# Altium integrated library ALTIUM-PHD_2_54_DUAL_SOCKET_HEADER_6130XX21821.IntLib: 198 symbols (part 1 of 2)
Pins are listed as number, name and electrical type; pins without a type are passive.

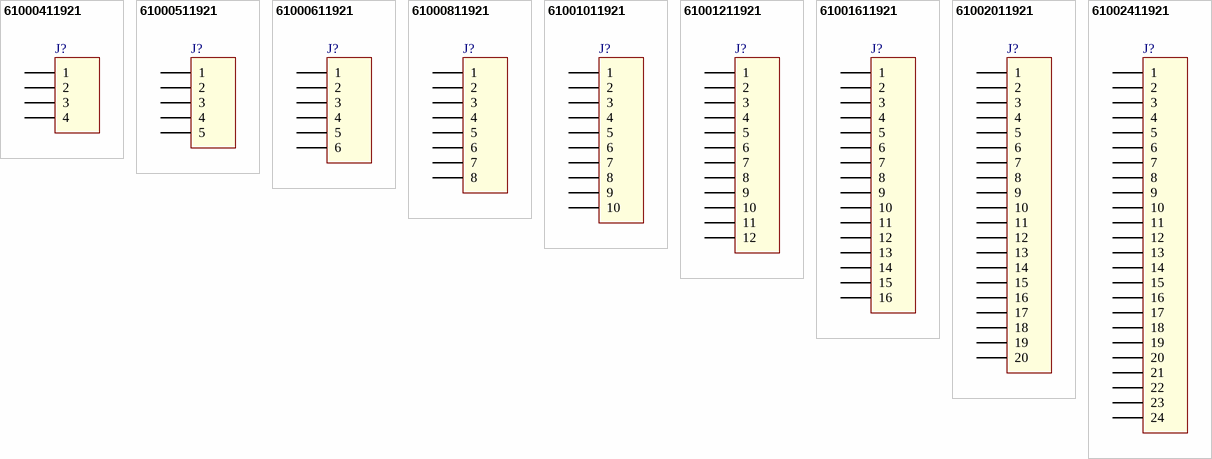
[diagram p0: symbols 61000411921 to 61002411921]

## 61000411921
designator J?
WR-PHD 2.54 mm SMT Socket Header, 4p; Part Number: 61000411921; Pin Number: 4; Rated Current: 3A; Working Voltage: 250V AC; Withstanding Voltage: 500V AC; Pitch: 2.54mm; ComponentLink1Description: Manufacturer; ComponentLink1URL: http://www.we-online.de; ComponentLink2Description: Datasheet; ComponentLink2URL: http://katalog.we-online.de/em/datasheet/6100xx11921.pdf; Published Date: August 2017; Publisher: Wurth Elektronik
footprint 61000411921
pins: 1, 2, 3, 4

## 61000511921
designator J?
WR-PHD 2.54 mm SMT Socket Header, 5p; Part Number: 61000511921; Pin Number: 5; Rated Current: 3A; Working Voltage: 250V AC; Withstanding Voltage: 500V AC; Pitch: 2.54mm; ComponentLink1Description: Manufacturer; ComponentLink1URL: http://www.we-online.de; ComponentLink2Description: Datasheet; ComponentLink2URL: http://katalog.we-online.de/em/datasheet/6100xx11921.pdf; Published Date: August 2017; Publisher: Wurth Elektronik
footprint 61000511921
pins: 1, 2, 3, 4, 5

## 61000611921
designator J?
WR-PHD 2.54 mm SMT Socket Header, 6p; Part Number: 61000611921; Pin Number: 6; Rated Current: 3A; Working Voltage: 250V AC; Withstanding Voltage: 500V AC; Pitch: 2.54mm; ComponentLink1Description: Manufacturer; ComponentLink1URL: http://www.we-online.de; ComponentLink2Description: Datasheet; ComponentLink2URL: http://katalog.we-online.de/em/datasheet/6100xx11921.pdf; Published Date: August 2017; Publisher: Wurth Elektronik
footprint 61000611921
pins: 1, 2, 3, 4, 5, 6

## 61000811921
designator J?
WR-PHD 2.54 mm SMT Socket Header, 8p; Part Number: 61000811921; Pin Number: 8; Rated Current: 3A; Working Voltage: 250V AC; Withstanding Voltage: 500V AC; Pitch: 2.54mm; ComponentLink1Description: Manufacturer; ComponentLink1URL: http://www.we-online.de; ComponentLink2Description: Datasheet; ComponentLink2URL: http://katalog.we-online.de/em/datasheet/6100xx11921.pdf; Published Date: August 2017; Publisher: Wurth Elektronik
footprint 61000811921
pins: 1, 2, 3, 4, 5, 6, 7, 8

## 61001011921
designator J?
WR-PHD 2.54 mm SMT Socket Header, 10p; Part Number: 61001011921; Pin Number: 10; Rated Current: 3A; Working Voltage: 250V AC; Withstanding Voltage: 500V AC; Pitch: 2.54mm; ComponentLink1Description: Manufacturer; ComponentLink1URL: http://www.we-online.de; ComponentLink2Description: Datasheet; ComponentLink2URL: http://katalog.we-online.de/em/datasheet/6100xx11921.pdf; Published Date: August 2017; Publisher: Wurth Elektronik
footprint 61001011921
pins: 1, 2, 3, 4, 5, 6, 7, 8, 9, 10

## 61001211921
designator J?
WR-PHD 2.54 mm SMT Socket Header, 12p; Part Number: 61001211921; Pin Number: 12; Rated Current: 3A; Working Voltage: 250V AC; Withstanding Voltage: 500V AC; Pitch: 2.54mm; ComponentLink1Description: Manufacturer; ComponentLink1URL: http://www.we-online.de; ComponentLink2Description: Datasheet; ComponentLink2URL: http://katalog.we-online.de/em/datasheet/6100xx11921.pdf; Published Date: August 2017; Publisher: Wurth Elektronik
footprint 61001211921
pins: 1, 2, 3, 4, 5, 6, 7, 8, 9, 10, 11, 12

## 61001611921
designator J?
WR-PHD 2.54 mm SMT Socket Header, 16p; Part Number: 61001611921; Pin Number: 16; Rated Current: 3A; Working Voltage: 250V AC; Withstanding Voltage: 500V AC; Pitch: 2.54mm; ComponentLink1Description: Manufacturer; ComponentLink1URL: http://www.we-online.de; ComponentLink2Description: Datasheet; ComponentLink2URL: http://katalog.we-online.de/em/datasheet/6100xx11921.pdf; Published Date: August 2017; Publisher: Wurth Elektronik
footprint 61001611921
pins: 1, 2, 3, 4, 5, 6, 7, 8, 9, 10, 11, 12, 13, 14, 15, 16

## 61002011921
designator J?
WR-PHD 2.54 mm SMT Socket Header, 20p; Part Number: 61002011921; Pin Number: 20; Rated Current: 3A; Working Voltage: 250V AC; Withstanding Voltage: 500V AC; Pitch: 2.54mm; ComponentLink1Description: Manufacturer; ComponentLink1URL: http://www.we-online.de; ComponentLink2Description: Datasheet; ComponentLink2URL: http://katalog.we-online.de/em/datasheet/6100xx11921.pdf; Published Date: August 2017; Publisher: Wurth Elektronik
footprint 61002011921
pins: 1, 2, 3, 4, 5, 6, 7, 8, 9, 10, 11, 12, 13, 14, 15, 16, 17, 18, 19, 20

## 61002411921
designator J?
WR-PHD 2.54 mm SMT Socket Header, 24p; Part Number: 61002411921; Pin Number: 24; Rated Current: 3A; Working Voltage: 250V AC; Withstanding Voltage: 500V AC; Pitch: 2.54mm; ComponentLink1Description: Manufacturer; ComponentLink1URL: http://www.we-online.de; ComponentLink2Description: Datasheet; ComponentLink2URL: http://katalog.we-online.de/em/datasheet/6100xx11921.pdf; Published Date: August 2017; Publisher: Wurth Elektronik
footprint 61002411921
pins: 1, 2, 3, 4, 5, 6, 7, 8, 9, 10, 11, 12, 13, 14, 15, 16, 17, 18, 19, 20, 21, 22, 23, 24


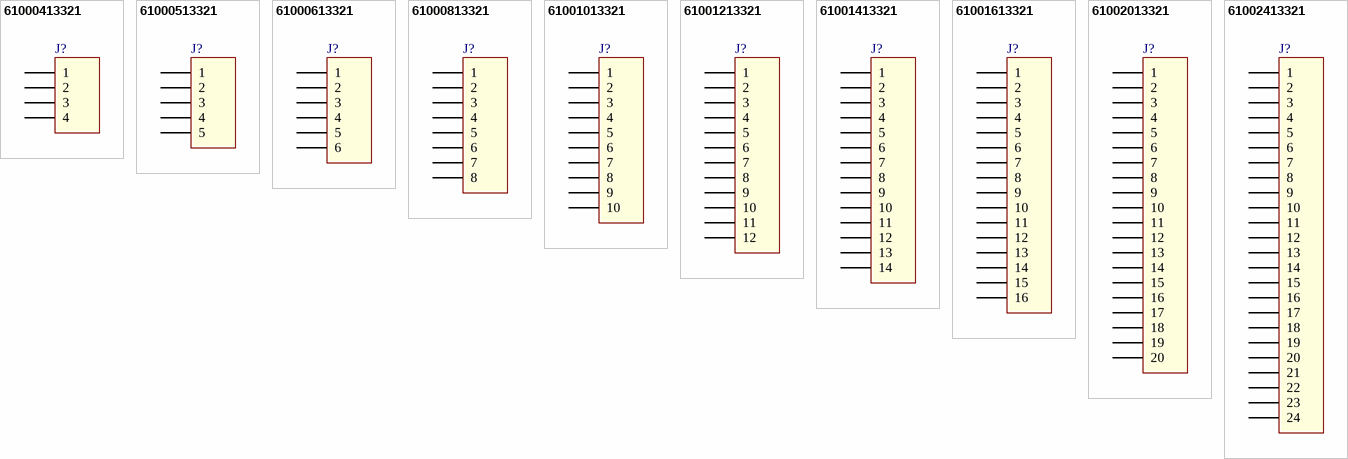
[diagram p1: symbols 61000413321 to 61002413321]

## 61000413321
designator J?
WR-PHD 2.54 mm SMT Socket Header, 4p; Part Number: 61000413321; Pin Number: 4; Rated Current: 3A; Working Voltage: 250V AC; Withstanding Voltage: 500V AC; Pitch: 2.54mm; ComponentLink1Description: Manufacturer; ComponentLink1URL: http://www.we-online.de; ComponentLink2Description: Datasheet; ComponentLink2URL: http://katalog.we-online.de/em/datasheet/6100xx13321.pdf; Published Date: August 2017; Publisher: Wurth Elektronik
footprint 61000413321
pins: 1, 2, 3, 4

## 61000513321
designator J?
WR-PHD 2.54 mm SMT Socket Header, 5p; Part Number: 61000513321; Pin Number: 5; Rated Current: 3A; Working Voltage: 250V AC; Withstanding Voltage: 500V AC; Pitch: 2.54mm; ComponentLink1Description: Manufacturer; ComponentLink1URL: http://www.we-online.de; ComponentLink2Description: Datasheet; ComponentLink2URL: http://katalog.we-online.de/em/datasheet/6100xx13321.pdf; Published Date: August 2017; Publisher: Wurth Elektronik
footprint 61000513321
pins: 1, 2, 3, 4, 5

## 61000613321
designator J?
WR-PHD 2.54 mm SMT Socket Header, 6p; Part Number: 61000613321; Pin Number: 6; Rated Current: 3A; Working Voltage: 250V AC; Withstanding Voltage: 500V AC; Pitch: 2.54mm; ComponentLink1Description: Manufacturer; ComponentLink1URL: http://www.we-online.de; ComponentLink2Description: Datasheet; ComponentLink2URL: http://katalog.we-online.de/em/datasheet/6100xx13321.pdf; Published Date: August 2017; Publisher: Wurth Elektronik
footprint 61000613321
pins: 1, 2, 3, 4, 5, 6

## 61000813321
designator J?
WR-PHD 2.54 mm SMT Socket Header, 8p; Part Number: 61000813321; Pin Number: 8; Rated Current: 3A; Working Voltage: 250V AC; Withstanding Voltage: 500V AC; Pitch: 2.54mm; ComponentLink1Description: Manufacturer; ComponentLink1URL: http://www.we-online.de; ComponentLink2Description: Datasheet; ComponentLink2URL: http://katalog.we-online.de/em/datasheet/6100xx13321.pdf; Published Date: August 2017; Publisher: Wurth Elektronik
footprint 61000813321
pins: 1, 2, 3, 4, 5, 6, 7, 8

## 61001013321
designator J?
WR-PHD 2.54 mm SMT Socket Header, 10p; Part Number: 61001013321; Pin Number: 10; Rated Current: 3A; Working Voltage: 250V AC; Withstanding Voltage: 500V AC; Pitch: 2.54mm; ComponentLink1Description: Manufacturer; ComponentLink1URL: http://www.we-online.de; ComponentLink2Description: Datasheet; ComponentLink2URL: http://katalog.we-online.de/em/datasheet/6100xx13321.pdf; Published Date: August 2017; Publisher: Wurth Elektronik
footprint 61001013321
pins: 1, 2, 3, 4, 5, 6, 7, 8, 9, 10

## 61001213321
designator J?
WR-PHD 2.54 mm SMT Socket Header, 12p; Part Number: 61001213321; Pin Number: 12; Rated Current: 3A; Working Voltage: 250V AC; Withstanding Voltage: 500V AC; Pitch: 2.54mm; ComponentLink1Description: Manufacturer; ComponentLink1URL: http://www.we-online.de; ComponentLink2Description: Datasheet; ComponentLink2URL: http://katalog.we-online.de/em/datasheet/6100xx13321.pdf; Published Date: August 2017; Publisher: Wurth Elektronik
footprint 61001213321
pins: 1, 2, 3, 4, 5, 6, 7, 8, 9, 10, 11, 12

## 61001413321
designator J?
WR-PHD 2.54 mm SMT Socket Header, 14p; Part Number: 61001413321; Pin Number: 14; Rated Current: 3A; Working Voltage: 250V AC; Withstanding Voltage: 500V AC; Pitch: 2.54mm; ComponentLink1Description: Manufacturer; ComponentLink1URL: http://www.we-online.de; ComponentLink2Description: Datasheet; ComponentLink2URL: http://katalog.we-online.de/em/datasheet/6100xx13321.pdf; Published Date: August 2017; Publisher: Wurth Elektronik
footprint 61001413321
pins: 1, 2, 3, 4, 5, 6, 7, 8, 9, 10, 11, 12, 13, 14

## 61001613321
designator J?
WR-PHD 2.54 mm SMT Socket Header, 16p; Part Number: 61001613321; Pin Number: 16; Rated Current: 3A; Working Voltage: 250V AC; Withstanding Voltage: 500V AC; Pitch: 2.54mm; ComponentLink1Description: Manufacturer; ComponentLink1URL: http://www.we-online.de; ComponentLink2Description: Datasheet; ComponentLink2URL: http://katalog.we-online.de/em/datasheet/6100xx13321.pdf; Published Date: August 2017; Publisher: Wurth Elektronik
footprint 61001613321
pins: 1, 2, 3, 4, 5, 6, 7, 8, 9, 10, 11, 12, 13, 14, 15, 16

## 61002013321
designator J?
WR-PHD 2.54 mm SMT Socket Header, 20p; Part Number: 61002013321; Pin Number: 20; Rated Current: 3A; Working Voltage: 250V AC; Withstanding Voltage: 500V AC; Pitch: 2.54mm; ComponentLink1Description: Manufacturer; ComponentLink1URL: http://www.we-online.de; ComponentLink2Description: Datasheet; ComponentLink2URL: http://katalog.we-online.de/em/datasheet/6100xx13321.pdf; Published Date: August 2017; Publisher: Wurth Elektronik
footprint 61002013321
pins: 1, 2, 3, 4, 5, 6, 7, 8, 9, 10, 11, 12, 13, 14, 15, 16, 17, 18, 19, 20

## 61002413321
designator J?
WR-PHD 2.54 mm SMT Socket Header, 24p; Part Number: 61002413321; Pin Number: 24; Rated Current: 3A; Working Voltage: 250V AC; Withstanding Voltage: 500V AC; Pitch: 2.54mm; ComponentLink1Description: Manufacturer; ComponentLink1URL: http://www.we-online.de; ComponentLink2Description: Datasheet; ComponentLink2URL: http://katalog.we-online.de/em/datasheet/6100xx13321.pdf; Published Date: August 2017; Publisher: Wurth Elektronik
footprint 61002413321
pins: 1, 2, 3, 4, 5, 6, 7, 8, 9, 10, 11, 12, 13, 14, 15, 16, 17, 18, 19, 20, 21, 22, 23, 24


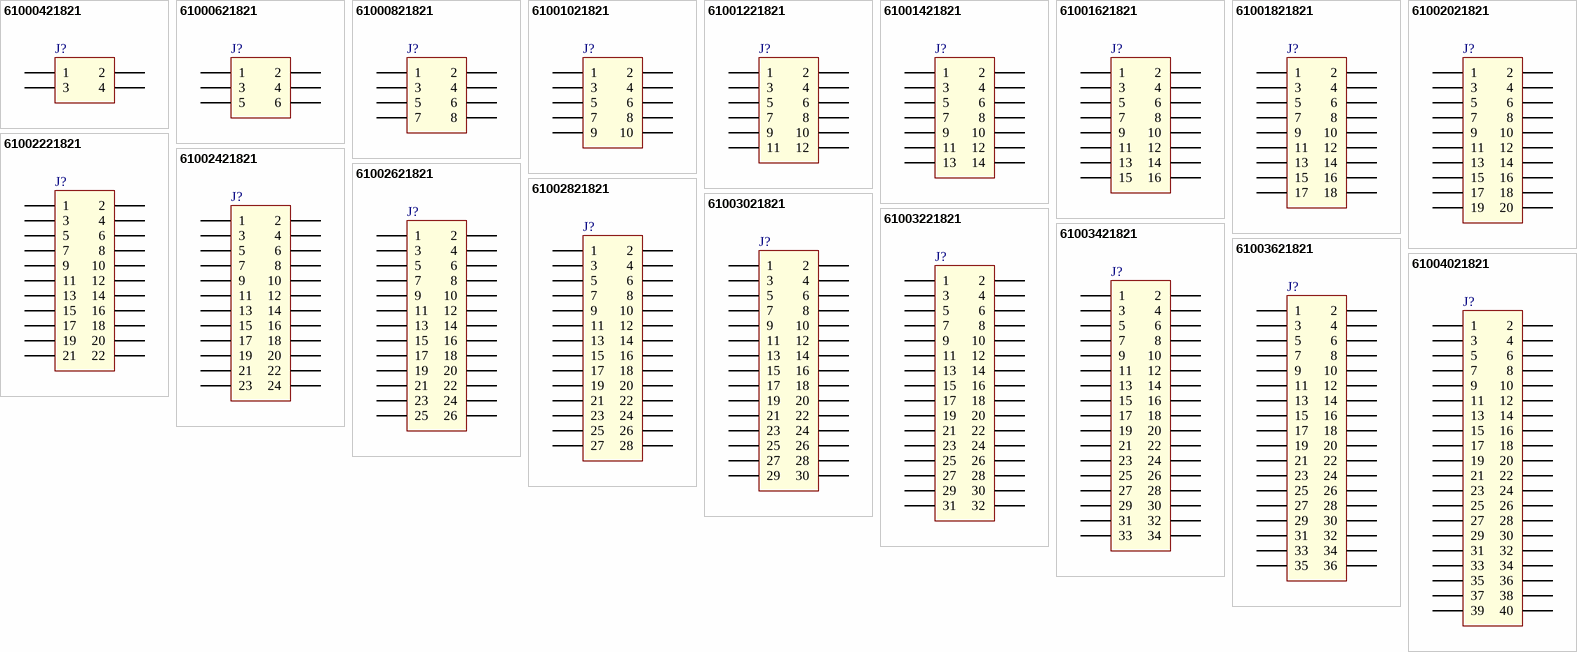
[diagram p2: symbols 61000421821 to 61004021821]

## 61000421821
designator J?
WR-PHD 2.54 mm Dual SMT Socket Header, 4p; Part Number: 61000421821; Pin Number: 4; Rated Current: 3A; Working Voltage: 250V AC; Withstanding Voltage: 600V AC; Pitch: 2.54mm; ComponentLink1Description: Manufacturer; ComponentLink1URL: http://www.we-online.de; ComponentLink2Description: Datasheet; ComponentLink2URL: http://katalog.we-online.de/em/datasheet/6100xx21821.pdf; Published Date: August 2017; Publisher: Wurth Elektronik
footprint 61000421821
pins: 1, 2, 3, 4

## 61000621821
designator J?
WR-PHD 2.54 mm Dual SMT Socket Header, 6p; Part Number: 61000621821; Pin Number: 6; Rated Current: 3A; Working Voltage: 250V AC; Withstanding Voltage: 600V AC; Pitch: 2.54mm; ComponentLink1Description: Manufacturer; ComponentLink1URL: http://www.we-online.de; ComponentLink2Description: Datasheet; ComponentLink2URL: http://katalog.we-online.de/em/datasheet/6100xx21821.pdf; Published Date: August 2017; Publisher: Wurth Elektronik
footprint 61000621821
pins: 1, 2, 3, 4, 5, 6

## 61000821821
designator J?
WR-PHD 2.54 mm Dual SMT Socket Header, 8p; Part Number: 61000821821; Pin Number: 8; Rated Current: 3A; Working Voltage: 250V AC; Withstanding Voltage: 600V AC; Pitch: 2.54mm; ComponentLink1Description: Manufacturer; ComponentLink1URL: http://www.we-online.de; ComponentLink2Description: Datasheet; ComponentLink2URL: http://katalog.we-online.de/em/datasheet/6100xx21821.pdf; Published Date: August 2017; Publisher: Wurth Elektronik
footprint 61000821821
pins: 1, 2, 3, 4, 5, 6, 7, 8

## 61001021821
designator J?
WR-PHD 2.54 mm Dual SMT Socket Header, 10p; Part Number: 61001021821; Pin Number: 10; Rated Current: 3A; Working Voltage: 250V AC; Withstanding Voltage: 600V AC; Pitch: 2.54mm; ComponentLink1Description: Manufacturer; ComponentLink1URL: http://www.we-online.de; ComponentLink2Description: Datasheet; ComponentLink2URL: http://katalog.we-online.de/em/datasheet/6100xx21821.pdf; Published Date: August 2017; Publisher: Wurth Elektronik
footprint 61001021821
pins: 1, 2, 3, 4, 5, 6, 7, 8, 9, 10

## 61001221821
designator J?
WR-PHD 2.54 mm Dual SMT Socket Header, 12p; Part Number: 61001221821; Pin Number: 12; Rated Current: 3A; Working Voltage: 250V AC; Withstanding Voltage: 600V AC; Pitch: 2.54mm; ComponentLink1Description: Manufacturer; ComponentLink1URL: http://www.we-online.de; ComponentLink2Description: Datasheet; ComponentLink2URL: http://katalog.we-online.de/em/datasheet/6100xx21821.pdf; Published Date: August 2017; Publisher: Wurth Elektronik
footprint 61001221821
pins: 1, 2, 3, 4, 5, 6, 7, 8, 9, 10, 11, 12

## 61001421821
designator J?
WR-PHD 2.54 mm Dual SMT Socket Header, 14p; Part Number: 61001421821; Pin Number: 14; Rated Current: 3A; Working Voltage: 250V AC; Withstanding Voltage: 600V AC; Pitch: 2.54mm; ComponentLink1Description: Manufacturer; ComponentLink1URL: http://www.we-online.de; ComponentLink2Description: Datasheet; ComponentLink2URL: http://katalog.we-online.de/em/datasheet/6100xx21821.pdf; Published Date: August 2017; Publisher: Wurth Elektronik
footprint 61001421821
pins: 1, 2, 3, 4, 5, 6, 7, 8, 9, 10, 11, 12, 13, 14

## 61001621821
designator J?
WR-PHD 2.54 mm Dual SMT Socket Header, 16p; Part Number: 61001621821; Pin Number: 16; Rated Current: 3A; Working Voltage: 250V AC; Withstanding Voltage: 600V AC; Pitch: 2.54mm; ComponentLink1Description: Manufacturer; ComponentLink1URL: http://www.we-online.de; ComponentLink2Description: Datasheet; ComponentLink2URL: http://katalog.we-online.de/em/datasheet/6100xx21821.pdf; Published Date: August 2017; Publisher: Wurth Elektronik
footprint 61001621821
pins: 1, 2, 3, 4, 5, 6, 7, 8, 9, 10, 11, 12, 13, 14, 15, 16

## 61001821821
designator J?
WR-PHD 2.54 mm Dual SMT Socket Header, 18p; Part Number: 61001821821; Pin Number: 18; Rated Current: 3A; Working Voltage: 250V AC; Withstanding Voltage: 600V AC; Pitch: 2.54mm; ComponentLink1Description: Manufacturer; ComponentLink1URL: http://www.we-online.de; ComponentLink2Description: Datasheet; ComponentLink2URL: http://katalog.we-online.de/em/datasheet/6100xx21821.pdf; Published Date: August 2017; Publisher: Wurth Elektronik
footprint 61001821821
pins: 1, 2, 3, 4, 5, 6, 7, 8, 9, 10, 11, 12, 13, 14, 15, 16, 17, 18

## 61002021821
designator J?
WR-PHD 2.54 mm Dual SMT Socket Header, 20p; Part Number: 61002021821; Pin Number: 20; Rated Current: 3A; Working Voltage: 250V AC; Withstanding Voltage: 600V AC; Pitch: 2.54mm; ComponentLink1Description: Manufacturer; ComponentLink1URL: http://www.we-online.de; ComponentLink2Description: Datasheet; ComponentLink2URL: http://katalog.we-online.de/em/datasheet/6100xx21821.pdf; Published Date: August 2017; Publisher: Wurth Elektronik
footprint 61002021821
pins: 1, 2, 3, 4, 5, 6, 7, 8, 9, 10, 11, 12, 13, 14, 15, 16, 17, 18, 19, 20

## 61002221821
designator J?
WR-PHD 2.54 mm Dual SMT Socket Header, 22p; Part Number: 61002221821; Pin Number: 22; Rated Current: 3A; Working Voltage: 250V AC; Withstanding Voltage: 600V AC; Pitch: 2.54mm; ComponentLink1Description: Manufacturer; ComponentLink1URL: http://www.we-online.de; ComponentLink2Description: Datasheet; ComponentLink2URL: http://katalog.we-online.de/em/datasheet/6100xx21821.pdf; Published Date: August 2017; Publisher: Wurth Elektronik
footprint 61002221821
pins: 1, 2, 3, 4, 5, 6, 7, 8, 9, 10, 11, 12, 13, 14, 15, 16, 17, 18, 19, 20, 21, 22

## 61002421821
designator J?
WR-PHD 2.54 mm Dual SMT Socket Header, 24p; Part Number: 61002421821; Pin Number: 24; Rated Current: 3A; Working Voltage: 250V AC; Withstanding Voltage: 600V AC; Pitch: 2.54mm; ComponentLink1Description: Manufacturer; ComponentLink1URL: http://www.we-online.de; ComponentLink2Description: Datasheet; ComponentLink2URL: http://katalog.we-online.de/em/datasheet/6100xx21821.pdf; Published Date: August 2017; Publisher: Wurth Elektronik
footprint 61002421821
pins: 1, 2, 3, 4, 5, 6, 7, 8, 9, 10, 11, 12, 13, 14, 15, 16, 17, 18, 19, 20, 21, 22, 23, 24

## 61002621821
designator J?
WR-PHD 2.54 mm Dual SMT Socket Header, 26p; Part Number: 61002621821; Pin Number: 26; Rated Current: 3A; Working Voltage: 250V AC; Withstanding Voltage: 600V AC; Pitch: 2.54mm; ComponentLink1Description: Manufacturer; ComponentLink1URL: http://www.we-online.de; ComponentLink2Description: Datasheet; ComponentLink2URL: http://katalog.we-online.de/em/datasheet/6100xx21821.pdf; Published Date: August 2017; Publisher: Wurth Elektronik
footprint 61002621821
pins: 1, 2, 3, 4, 5, 6, 7, 8, 9, 10, 11, 12, 13, 14, 15, 16, 17, 18, 19, 20, 21, 22, 23, 24, 25, 26

## 61002821821
designator J?
WR-PHD 2.54 mm Dual SMT Socket Header, 28p; Part Number: 61002821821; Pin Number: 28; Rated Current: 3A; Working Voltage: 250V AC; Withstanding Voltage: 600V AC; Pitch: 2.54mm; ComponentLink1Description: Manufacturer; ComponentLink1URL: http://www.we-online.de; ComponentLink2Description: Datasheet; ComponentLink2URL: http://katalog.we-online.de/em/datasheet/6100xx21821.pdf; Published Date: August 2017; Publisher: Wurth Elektronik
footprint 61002821821
pins: 1, 2, 3, 4, 5, 6, 7, 8, 9, 10, 11, 12, 13, 14, 15, 16, 17, 18, 19, 20, 21, 22, 23, 24, 25, 26, 27, 28

## 61003021821
designator J?
WR-PHD 2.54 mm Dual SMT Socket Header, 30p; Part Number: 61003021821; Pin Number: 30; Rated Current: 3A; Working Voltage: 250V AC; Withstanding Voltage: 600V AC; Pitch: 2.54mm; ComponentLink1Description: Manufacturer; ComponentLink1URL: http://www.we-online.de; ComponentLink2Description: Datasheet; ComponentLink2URL: http://katalog.we-online.de/em/datasheet/6100xx21821.pdf; Published Date: August 2017; Publisher: Wurth Elektronik
footprint 61003021821
pins: 1, 2, 3, 4, 5, 6, 7, 8, 9, 10, 11, 12, 13, 14, 15, 16, 17, 18, 19, 20, 21, 22, 23, 24, 25, 26, 27, 28, 29, 30

## 61003221821
designator J?
WR-PHD 2.54 mm Dual SMT Socket Header, 32p; Part Number: 61003221821; Pin Number: 32; Rated Current: 3A; Working Voltage: 250V AC; Withstanding Voltage: 600V AC; Pitch: 2.54mm; ComponentLink1Description: Manufacturer; ComponentLink1URL: http://www.we-online.de; ComponentLink2Description: Datasheet; ComponentLink2URL: http://katalog.we-online.de/em/datasheet/6100xx21821.pdf; Published Date: August 2017; Publisher: Wurth Elektronik
footprint 61003221821
pins: 1, 2, 3, 4, 5, 6, 7, 8, 9, 10, 11, 12, 13, 14, 15, 16, 17, 18, 19, 20, 21, 22, 23, 24, 25, 26, 27, 28, 29, 30, 31, 32

## 61003421821
designator J?
WR-PHD 2.54 mm Dual SMT Socket Header, 34p; Part Number: 61003421821; Pin Number: 34; Rated Current: 3A; Working Voltage: 250V AC; Withstanding Voltage: 600V AC; Pitch: 2.54mm; ComponentLink1Description: Manufacturer; ComponentLink1URL: http://www.we-online.de; ComponentLink2Description: Datasheet; ComponentLink2URL: http://katalog.we-online.de/em/datasheet/6100xx21821.pdf; Published Date: August 2017; Publisher: Wurth Elektronik
footprint 61003421821
pins: 1, 2, 3, 4, 5, 6, 7, 8, 9, 10, 11, 12, 13, 14, 15, 16, 17, 18, 19, 20, 21, 22, 23, 24, 25, 26, 27, 28, 29, 30, 31, 32, 33, 34

## 61003621821
designator J?
WR-PHD 2.54 mm Dual SMT Socket Header, 36p; Part Number: 61003621821; Pin Number: 36; Rated Current: 3A; Working Voltage: 250V AC; Withstanding Voltage: 600V AC; Pitch: 2.54mm; ComponentLink1Description: Manufacturer; ComponentLink1URL: http://www.we-online.de; ComponentLink2Description: Datasheet; ComponentLink2URL: http://katalog.we-online.de/em/datasheet/6100xx21821.pdf; Published Date: August 2017; Publisher: Wurth Elektronik
footprint 61003621821
pins: 1, 2, 3, 4, 5, 6, 7, 8, 9, 10, 11, 12, 13, 14, 15, 16, 17, 18, 19, 20, 21, 22, 23, 24, 25, 26, 27, 28, 29, 30, 31, 32, 33, 34, 35, 36

## 61004021821
designator J?
WR-PHD 2.54 mm Dual SMT Socket Header, 40p; Part Number: 61004021821; Pin Number: 40; Rated Current: 3A; Working Voltage: 250V AC; Withstanding Voltage: 600V AC; Pitch: 2.54mm; ComponentLink1Description: Manufacturer; ComponentLink1URL: http://www.we-online.de; ComponentLink2Description: Datasheet; ComponentLink2URL: http://katalog.we-online.de/em/datasheet/6100xx21821.pdf; Published Date: August 2017; Publisher: Wurth Elektronik
footprint 61004021821
pins: 1, 2, 3, 4, 5, 6, 7, 8, 9, 10, 11, 12, 13, 14, 15, 16, 17, 18, 19, 20, 21, 22, 23, 24, 25, 26, 27, 28, 29, 30, 31, 32, 33, 34, 35, 36, 37, 38, 39, 40


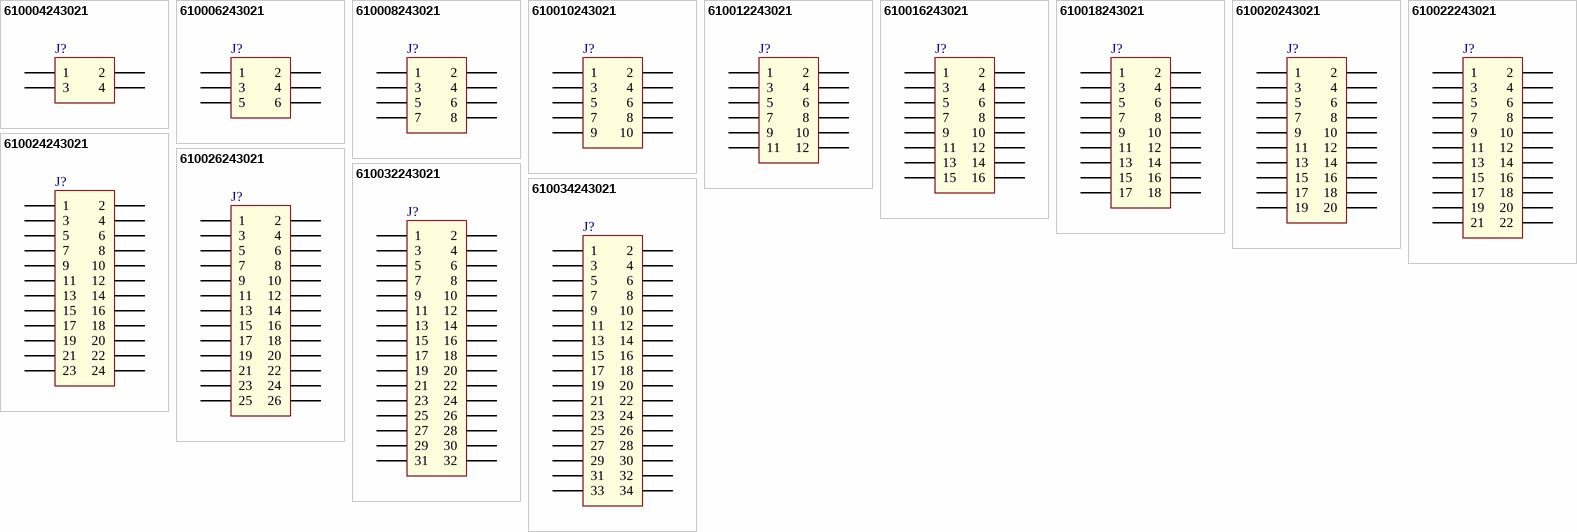
[diagram p3: symbols 610004243021 to 610034243021]

## 610004243021
designator J?
WR-PHD 2.54 mm SMT Dual Socket Header Bottom Entry, 4p; Part Number: 610004243021; Pin Number: 4; Rated Current: 3A; Working Voltage: 250V AC; Withstanding Voltage: 500V AC; Pitch: 2.54mm; ComponentLink1Description: Manufacturer; ComponentLink1URL: http://www.we-online.de; ComponentLink2Description: Datasheet; ComponentLink2URL: http://katalog.we-online.de/em/datasheet/6100xx243021.pdf; Published Date: August 2017; Publisher: Wurth Elektronik
footprint 610004243021
pins: 1, 2, 3, 4

## 610006243021
designator J?
WR-PHD 2.54 mm SMT Dual Socket Header Bottom Entry, 6p; Part Number: 610006243021; Pin Number: 6; Rated Current: 3A; Working Voltage: 250V AC; Withstanding Voltage: 500V AC; Pitch: 2.54mm; ComponentLink1Description: Manufacturer; ComponentLink1URL: http://www.we-online.de; ComponentLink2Description: Datasheet; ComponentLink2URL: http://katalog.we-online.de/em/datasheet/6100xx243021.pdf; Published Date: August 2017; Publisher: Wurth Elektronik
footprint 610006243021
pins: 1, 2, 3, 4, 5, 6

## 610008243021
designator J?
WR-PHD 2.54 mm SMT Dual Socket Header Bottom Entry, 8p; Part Number: 610008243021; Pin Number: 8; Rated Current: 3A; Working Voltage: 250V AC; Withstanding Voltage: 500V AC; Pitch: 2.54mm; ComponentLink1Description: Manufacturer; ComponentLink1URL: http://www.we-online.de; ComponentLink2Description: Datasheet; ComponentLink2URL: http://katalog.we-online.de/em/datasheet/6100xx243021.pdf; Published Date: August 2017; Publisher: Wurth Elektronik
footprint 610008243021
pins: 1, 2, 3, 4, 5, 6, 7, 8

## 610010243021
designator J?
WR-PHD 2.54 mm SMT Dual Socket Header Bottom Entry, 10p; Part Number: 610010243021; Pin Number: 10; Rated Current: 3A; Working Voltage: 250V AC; Withstanding Voltage: 500V AC; Pitch: 2.54mm; ComponentLink1Description: Manufacturer; ComponentLink1URL: http://www.we-online.de; ComponentLink2Description: Datasheet; ComponentLink2URL: http://katalog.we-online.de/em/datasheet/6100xx243021.pdf; Published Date: August 2017; Publisher: Wurth Elektronik
footprint 610010243021
pins: 1, 2, 3, 4, 5, 6, 7, 8, 9, 10
